# Altium footprint library 04.连接器件.pcb.PCBLIB: 363 footprints (part 2 of 23)
Each footprint in its own frame and in the unit in brackets; x right, y up, seen from the top. Pads: shape width x height; smd on the part's side, far side on the other; paste and mask are expansions set on the pad; w line width, h text height; cw(c..) or ccw(c..) is an arc to the next point about the centre after c.
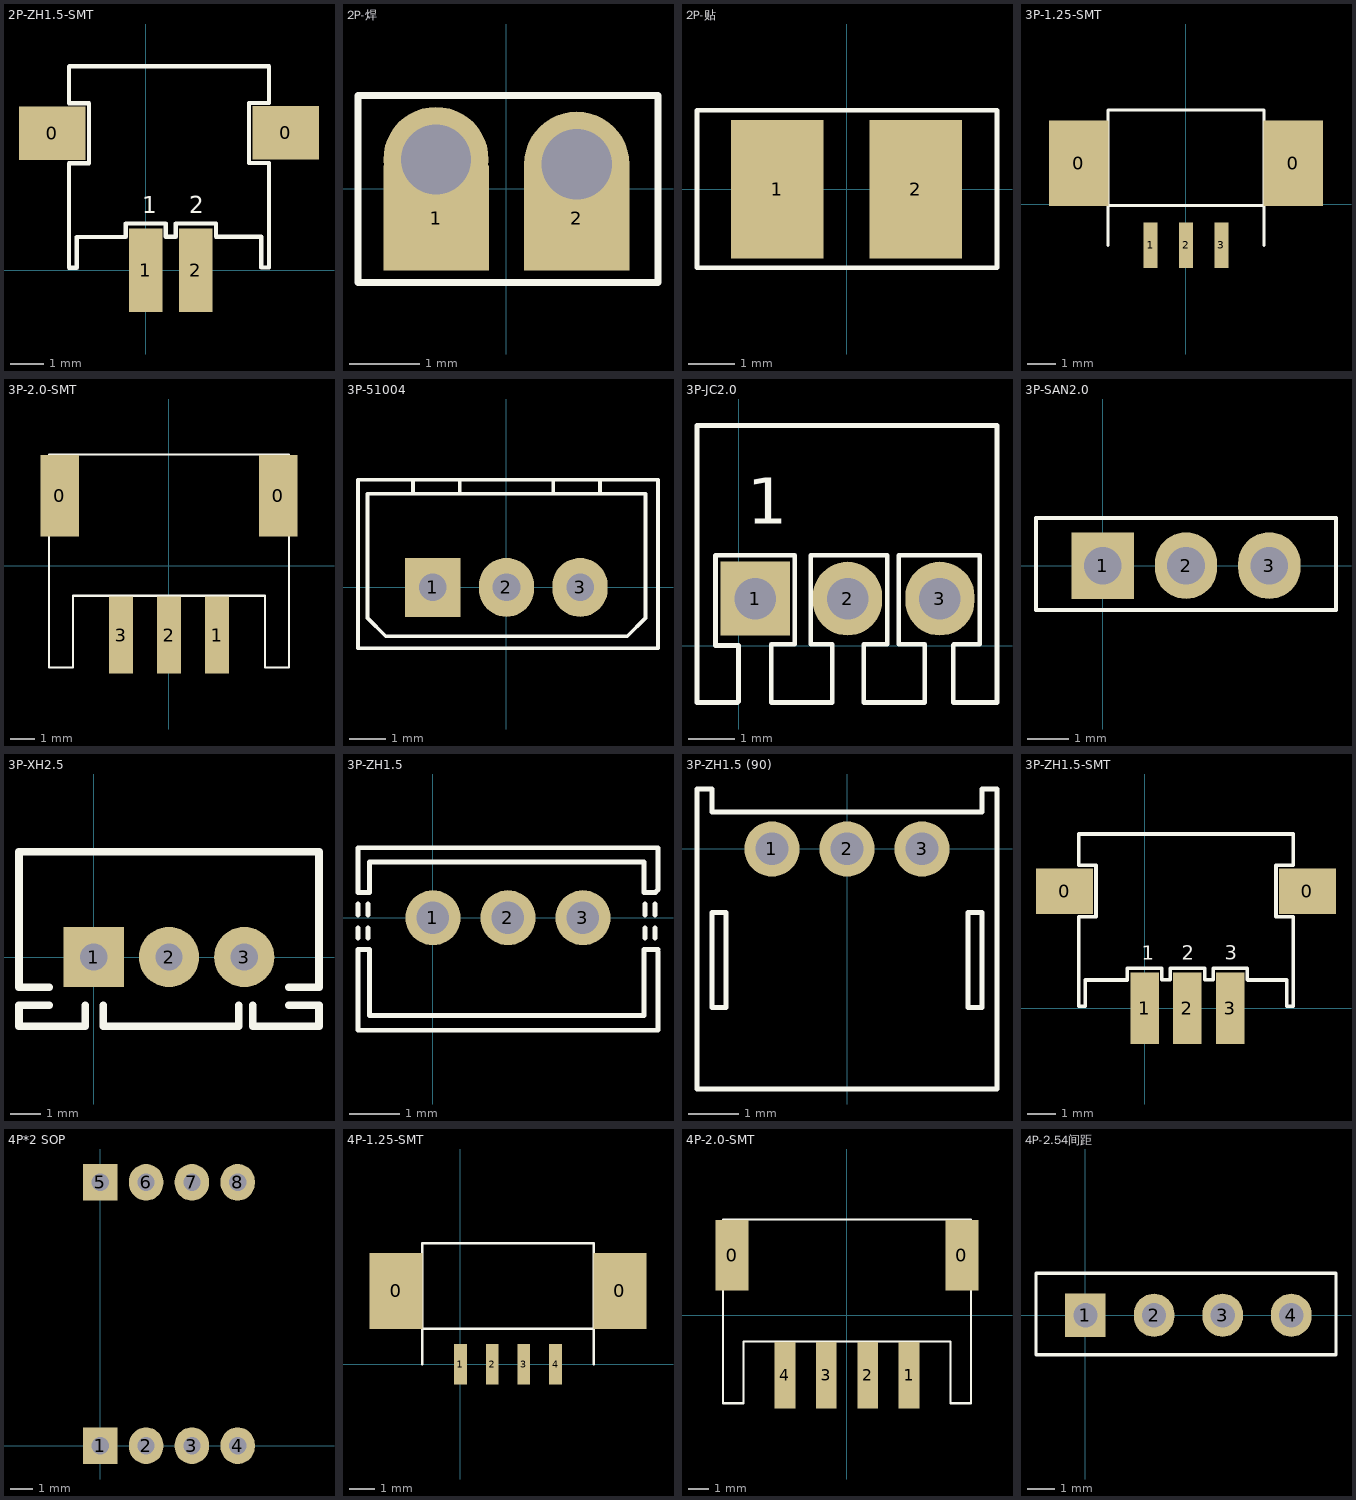
[diagram p1: the footprints below, top view; thin cyan lines are the x and y axes]

## 2P-ZH1.5-SMT [mm]
pads (4):
  rect 2x1.6 smd: 0(-2.8,4.1) 0(4.19,4.11)
  rect 1x2.5 smd: 1(0,0) 2(1.5,0)
TopOverlay:
  lines w0.127: -2.3,0.07 -2.07,0.07 -2.07,0.99 -0.61,0.99 -0.6,1 -0.6,1.4 0.6,1.4 0.6,1 0.9,1 0.9,1.4 2.1,1.4 2.1,1 3.46,1 3.46,0.08 3.69,0.08 3.69,3.21 3.09,3.21 3.09,5.01 3.69,5.01 3.69,6.11 -2.29,6.11 -2.3,6.1 -2.3,5 -1.7,5 -1.7,3.2 -2.3,3.2 -2.3,0.07
  text "2" at 1.3,1.7 h0.5
  text "1" at -0.1,1.7 h0.5
3D body "2P-ZH1.5-SMT.STEP": height 3.7, standoff -0.25, extent -2.311,-0.33 3.689,6.17

## 2P-焊 [mm]
pads (4):
  rect 1.5x1.5 all layers, no hole: 1(-0.997,-0.417) 2(1.003,-0.416)
  round 1.5 hole 1: ""(-1.003,0.417) ""(1.003,0.351)
TopOverlay:
  lines w0.1: -2.113,-1.333 2.16,-1.333 2.16,1.328 -2.113,1.328 -2.113,-1.333

## 2P-贴 [mm]
pads (2):
  rect 2x3 smd: 1(-1.5,0) 2(1.5,0)
TopOverlay:
  lines w0.1: -3.24,-1.701 3.258,-1.701 3.258,1.707 -3.24,1.707 -3.24,-1.701

## 3P-1.25-SMT [mm]
pads (5):
  rect 2.1x3 smd: 0(-3.79,1.448) 0(3.79,1.448)
  rect 0.5x1.6 smd: 1(-1.25,-1.448) 2(0,-1.448) 3(1.25,-1.448)
TopOverlay:
  lines w0.1: -2.75,-1.448 -2.75,2.997 -2.75,3.326 2.75,3.326 2.75,-1.448 ; -2.75,-0.048 -1.25,-0.048 2.748,-0.048
3D body: height 3.7, standoff 0, extent -4.933,-0.152 4.875,3.378
3D body: height 0.3, standoff 0, extent -1.606,-2.261 -0.894,-0.048
3D body: height 0.3, standoff 0, extent -0.361,-2.261 0.35,-0.048
3D body: height 0.3, standoff 0, extent 0.909,-2.261 1.62,-0.048

## 3P-2.0-SMT [mm]
pads (5):
  rect 1.6x3.4 smd: 0(-4.55,2.9) 0(4.55,2.9)
  rect 1x3.2 smd: 1(2,-2.9) 2(0,-2.9) 3(-2,-2.9)
TopOverlay:
  lines w0.1: -1.93,4.628 5,4.628 5,-4.25 4,-4.25 4,-1.265 0.75,-1.265 ; 0.781,-1.265 -4,-1.265 -4,-4.25 -5,-4.25 -5,4.628 3.93,4.628
3D body: height 0.3, standoff 0, extent -2.5,-3.713 -1.5,-0.55
3D body: height 5.6, standoff 0, extent -5,-1.275 5,4.628
3D body: height 0.3, standoff 0, extent -0.5,-3.713 0.5,-0.55
3D body: height 0.3, standoff 0, extent 1.5,-3.713 2.5,-0.55
3D body: height 3.2, standoff 0, extent -5,-3.256 -4.3,-0.993
3D body: height 3.2, standoff 0, extent 4.25,-3.239 5,-0.976

## 3P-51004 [mm]
pads (3):
  rect 1.5x1.6 hole 0.75: 1(-2,0)
  oval 1.5x1.6 hole 0.75: 2(0,0) 3(2,0)
TopOverlay:
  lines w0.1: -2.54,2.54 -2.54,2.921 ; -1.27,2.54 -1.27,2.921 ; 1.27,2.54 1.27,2.921 ; 2.54,2.54 2.54,2.921 ; -4.032,-1.651 4.115,-1.651 4.115,2.921 -4.032,2.921 -4.032,-1.651 ; -3.774,-0.833 -3.282,-1.325 3.282,-1.325 3.774,-0.833 3.774,2.54 -3.774,2.54 -3.774,-0.833
3D body "510004-3.STEP": height 5.9, standoff -3.47, extent -3.962,-1.555 4.038,2.845

## 3P-JC2.0 [mm]
pads (3):
  rect 1.5x1.6 hole 0.9: 1(0.362,1.016)
  oval 1.5x1.6 hole 0.9: 2(2.362,1.016) 3(4.362,1.016)
TopOverlay:
  lines w0.1: 1.562,-1.234 1.985,-1.234 2,-1.219 ; 4.652,0.011 4.652,-1.234 5.6,-1.234 5.6,4.766 -0.9,4.766 -0.9,1.294 -0.9,-1.234 -0.015,-1.234 0,-1.219 0,0 -0.5,0 -0.5,1.956 1.219,1.956 1.219,0.025 0.711,0.025 0.711,-1.234 2.032,-1.234 2.032,0.025 1.562,0.025 1.562,1.956 3.219,1.956 3.219,0.025 2.711,0.025 2.711,-1.234 4.032,-1.234 4.032,0.025 3.473,0.025 3.473,1.956 5.226,1.956 5.226,0.025 4.667,0.025
  text "1" at 0.184,2.642 h1
3D body "3P-JC2.0.STEP": height 3.4, standoff -3.22, extent -0.9,-6.234 5.6,4.766

## 3P-SAN2.0 [mm]
pads (3):
  rect 1.5x1.6 hole 0.9: 1(0,0)
  oval 1.5x1.6 hole 0.9: 2(2,0) 3(4,0)
TopOverlay:
  lines w0.1: -1.6,-1.067 -1.6,1.143 5.6,1.143 5.6,-1.067 4.825,-1.067 -1.6,-1.067

## 3P-XH2.5 [mm]
pads (3):
  rect 2x2 hole 0.9: 1(0,0)
  round 2 hole 0.9: 2(2.5,0) 3(5,0)
TopOverlay:
  lines w0.254: -1.48,-1.6 -2.48,-1.6 -2.48,-2.3 -0.58,-2.3 ; -1.48,-1 -2.48,-1 -2.48,3.5 7.48,3.5 7.48,-1 6.48,-1 ; -0.88,-2.3 -0.28,-2.3 -0.28,-1.6 ; 0.32,-1.6 0.32,-2.3 0.62,-2.3 3.82,-2.3 4.22,-2.3 4.82,-2.3 4.82,-1.6 ; 5.28,-1.6 5.28,-2.3 5.88,-2.3 ; 5.58,-2.3 7.48,-2.3 7.48,-1.6 6.48,-1.6
3D body "3PIN-XH2.5.STEP": height 5.9, standoff -3.47, extent -2.435,-2.25 7.465,3.5

## 3P-ZH1.5 [mm]
pads (3):
  round 1.1 hole 0.65: 1(0,0) 2(1.5,0) 3(3,0)
TopOverlay:
  lines w0.1: -1.499,-0.406 -1.499,-0.203 ; -1.499,0.051 -1.499,0.279 ; -1.295,-0.406 -1.295,-0.203 ; -1.295,0.051 -1.295,0.279 ; 4.242,-0.406 4.242,-0.203 ; 4.242,0.051 4.242,0.279 ; 4.445,-0.406 4.445,-0.203 ; 4.445,0.051 4.445,0.279 ; 4.5,-0.682 4.5,-2.25 -1.5,-2.25 -1.5,-0.635 -1.27,-0.635 -1.27,-1.956 4.216,-1.956 4.216,-0.635 4.5,-0.635 ; -1.5,0.508 -1.5,1.4 4.5,1.4 4.5,0.562 4.446,0.508 4.216,0.508 4.216,1.118 -1.27,1.118 -1.27,0.508 -1.5,0.508
3D body "3P-ZH1.5.STEP": height 4.6, standoff -2.45, extent -1.501,-2.286 4.499,1.364

## 3P-ZH1.5 (90) [mm]
pads (3):
  round 1.1 hole 0.65: 1(-1.5,0) 2(0,0) 3(1.5,0)
TopOverlay:
  lines w0.1: -2.718,1.2 -3,1.2 -3,-4.8 3,-4.8 3,1.2 2.718,1.2 ; -2.7,1.2 -2.7,0.737 2.7,0.737 2.7,1.2 ; -2.7,-3.175 -2.7,-1.27 -2.418,-1.27 -2.418,-3.175 -2.7,-3.175 ; 2.418,-3.175 2.418,-1.27 2.7,-1.27 2.7,-3.175 2.418,-3.175

## 3P-ZH1.5-SMT [mm]
pads (5):
  rect 2x1.6 smd: 0(-2.8,4.1) 0(5.7,4.1)
  rect 1x2.5 smd: 1(0,0) 2(1.5,0) 3(3,0)
TopOverlay:
  lines w0.127: -2.3,0.07 -2.07,0.07 -2.07,0.99 -0.61,0.99 -0.6,1 -0.6,1.4 0.6,1.4 0.6,1 0.9,1 0.9,1.4 2.1,1.4 2.1,1 2.4,1 2.4,1.4 3.6,1.4 3.6,1 3.61,0.99 4.97,0.99 4.97,0.07 5.2,0.07 5.2,3.2 4.6,3.2 4.6,5 5.2,5 5.2,6.1 -2.3,6.1 -2.3,5 -1.7,5 -1.7,3.2 -2.3,3.2 -2.3,0.07
  text "3" at 2.8,1.7 h0.5
  text "2" at 1.3,1.7 h0.5
  text "1" at -0.1,1.7 h0.5
3D body "3P-ZH1.5-SMT.STEP": height 3.7, standoff -0.25, extent -2.277,-0.48 5.223,6.02

## 4P*2 SOP [mm]
pads (8):
  rect 1.5x1.6 hole 0.75: 1(0,0) 5(0,11.5)
  oval 1.5x1.6 hole 0.75: 2(2,0) 3(4,0) 4(6,0) 6(2,11.5) 7(4,11.5) 8(6,11.5)

## 4P-1.25-SMT [mm]
pads (6):
  rect 2.1x3 smd: 0(-2.54,2.896) 0(6.29,2.896)
  rect 0.5x1.6 smd: 1(0,0) 2(1.25,0) 3(2.5,0) 4(3.75,0)
TopOverlay:
  lines w0.1: -1.5,0 -1.5,4.445 -1.5,4.774 5.232,4.774 ; -1.5,1.4 0,1.4 5.25,1.4 ; 5.25,0 5.25,4.774
3D body: height 3.7, standoff 0, extent -3.683,1.295 7.442,4.826
3D body: height 0.3, standoff 0, extent -0.356,-0.813 0.356,1.4
3D body: height 0.3, standoff 0, extent 0.889,-0.813 1.6,1.4
3D body: height 0.3, standoff 0, extent 2.159,-0.813 2.87,1.4
3D body: height 0.3, standoff 0, extent 3.404,-0.813 4.115,1.4

## 4P-2.0-SMT [mm]
pads (6):
  rect 1.6x3.4 smd: 0(-5.55,2.9) 0(5.55,2.9)
  rect 1x3.2 smd: 1(3,-2.9) 2(1,-2.9) 3(-1,-2.9) 4(-3,-2.9)
TopOverlay:
  lines w0.1: -0.93,4.628 6,4.628 6,-4.25 5,-4.25 5,-1.265 1.75,-1.265 ; 1.781,-1.265 -5,-1.265 -5,-4.25 -6,-4.25 -6,4.628 4.93,4.628
3D body: height 0.3, standoff 0, extent -3.5,-3.713 -2.5,-0.55
3D body: height 3.2, standoff 0, extent 5.25,-3.239 6,-0.976
3D body: height 3.2, standoff 0, extent -5.999,-3.185 -5.299,-0.922
3D body: height 0.3, standoff 0, extent 2.5,-3.713 3.5,-0.55
3D body: height 0.3, standoff 0, extent 0.5,-3.713 1.5,-0.55
3D body: height 5.6, standoff 0, extent -6,-1.275 6,4.628
3D body: height 0.3, standoff 0, extent -1.5,-3.713 -0.5,-0.55

## 4P-2.54间距 [mm] "单排直插排针母座 1*4P 间距2.54MM 塑高8.5MM"
height 8.5
pads (4):
  rect 1.5x1.6 hole 0.9: 1(0,0)
  oval 1.5x1.6 hole 0.9: 2(2.54,0) 3(5.08,0) 4(7.62,0)
TopOverlay:
  lines w0.127: -1.832,-1.456 9.276,-1.456 9.276,1.549 -1.832,1.549 -1.832,-1.456
3D body: height 8.5, standoff 0, extent -1.832,-1.456 9.276,1.549